# Altium footprint library Flight_controller v1.0.PcbLib: 98 footprints (part 5 of 7)
Each footprint in its own frame and in the unit in brackets; x right, y up, seen from the top. Pads: shape width x height; smd on the part's side, far side on the other; paste and mask are expansions set on the pad; w line width, h text height; cw(c..) or ccw(c..) is an arc to the next point about the centre after c.
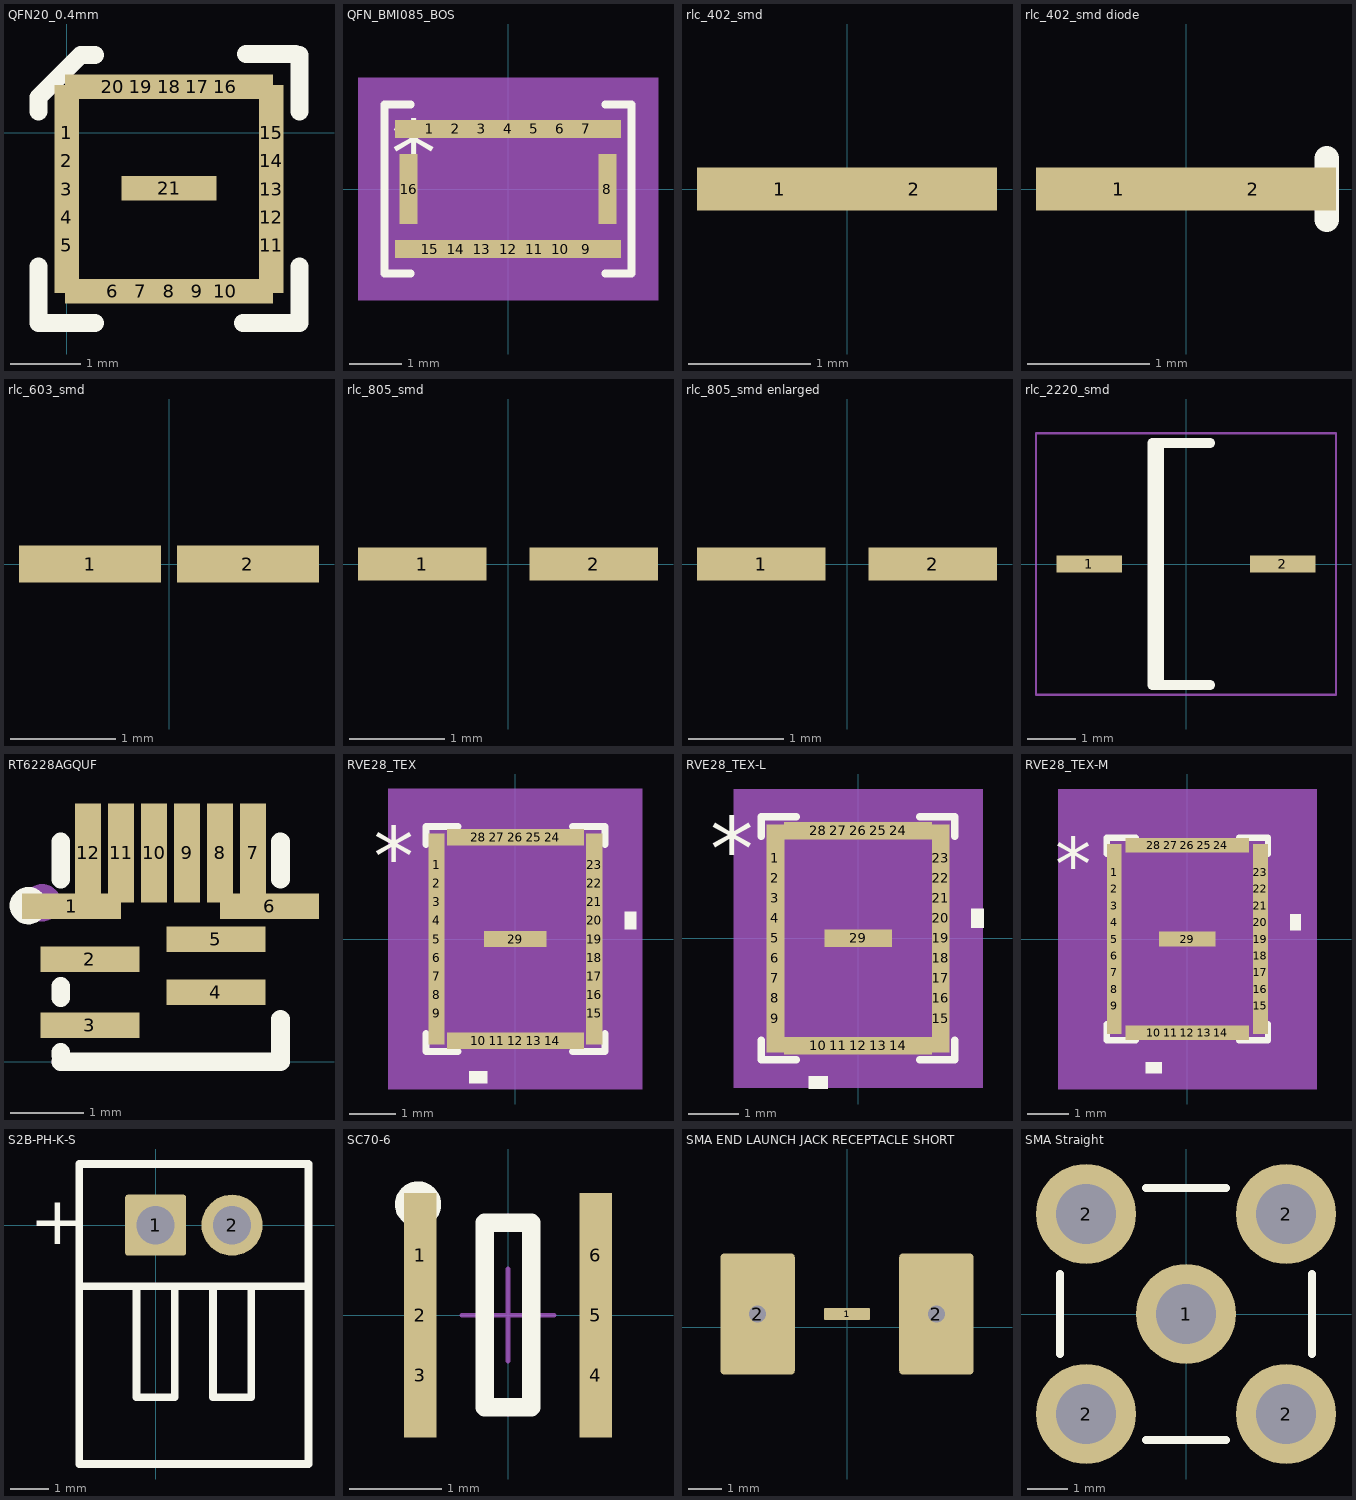
[diagram p4: the footprints below, top view; thin cyan lines are the x and y axes]

## QFN20_0.4mm [mm]
pads (21):
  rect 0.35x1.35 smd paste+0.05 mask+0.05: 1(0,0) 2(0,-0.4) 3(0,-0.8) 4(0,-1.2) 5(0,-1.6) 11(2.9,-1.6) 12(2.9,-1.2) 13(2.9,-0.8) 14(2.9,-0.4) 15(2.9,0)
  rect 1.35x0.35 smd paste+0.05 mask+0.05: 6(0.65,-2.25) 7(1.05,-2.25) 8(1.45,-2.25) 9(1.85,-2.25) 10(2.25,-2.25) 16(2.25,0.65) 17(1.85,0.65) 18(1.45,0.65) 19(1.05,0.65) 20(0.65,0.65) 21(1.45,-0.79)
Top Overlay:
  lines w0.254: -0.4,-1.9 -0.4,-2.7 0.4,-2.7 ; -0.4,0.3 -0.4,0.5 0.2,1.1 0.4,1.1 ; 2.5,-2.7 3.3,-2.7 3.3,-1.9 ; 2.54,1.11 3.24,1.11 ; 3.3,0.3 3.3,1.1

## QFN_BMI085_BOS [mm]
pads (16):
  rect 1.35x0.35 smd paste+0.05 mask+0.05: 1(-1.5,1.156) 2(-1,1.156) 3(-0.5,1.156) 4(0,1.156) 5(0.5,1.156) 6(1,1.156) 7(1.5,1.156) 9(1.5,-1.156) 10(1,-1.156) 11(0.5,-1.156) 12(0,-1.156) 13(-0.5,-1.156) 14(-1,-1.156) 15(-1.5,-1.156)
  rect 0.35x1.35 smd paste+0.05 mask+0.05: 8(1.911,0) 16(-1.911,0)
Top Overlay:
  lines w0.152: -1.869,-1.626 -2.375,-1.626 -2.375,1.626 -1.869,1.626 ; 1.869,-1.626 2.375,-1.626 2.375,1.626 1.869,1.626
  text "*" at -2.248,0.076 h1.27
Mechanical 5:
  region: -2.883,2.134 -2.883,-2.134 2.883,-2.134 2.883,2.134
Mechanical 13:
  lines w0.025: -2.248,0.229 -0.978,1.499 ; -2.248,-1.499 2.248,-1.499 2.248,1.499 -2.248,1.499 -2.248,-1.499 ; -2.248,-0.127 -2.248,0.127 -1.626,0.127 -1.626,-0.127 -2.248,-0.127 ; -1.627,-1.499 -1.373,-1.499 -1.373,-1.397 -1.627,-1.397 -1.627,-1.499 ; -1.627,1.397 -1.373,1.397 -1.373,1.499 -1.627,1.499 -1.627,1.397 ; -1.127,-1.499 -0.873,-1.499 -0.873,-1.397 -1.127,-1.397 -1.127,-1.499 ; -1.127,1.397 -0.873,1.397 -0.873,1.499 -1.127,1.499 -1.127,1.397 ; -0.627,-1.499 -0.373,-1.499 -0.373,-1.397 -0.627,-1.397 -0.627,-1.499 ; -0.627,1.397 -0.373,1.397 -0.373,1.499 -0.627,1.499 -0.627,1.397 ; -0.127,-1.499 0.127,-1.499 0.127,-1.397 -0.127,-1.397 -0.127,-1.499 ; -0.127,1.397 0.127,1.397 0.127,1.499 -0.127,1.499 -0.127,1.397 ; 0.373,-1.499 0.627,-1.499 0.627,-1.397 0.373,-1.397 0.373,-1.499 ; 0.373,1.397 0.627,1.397 0.627,1.499 0.373,1.499 0.373,1.397 ; 0.873,-1.499 1.127,-1.499 1.127,-1.397 0.873,-1.397 0.873,-1.499 ; 0.873,1.397 1.127,1.397 1.127,1.499 0.873,1.499 0.873,1.397 ; 1.373,-1.499 1.627,-1.499 1.627,-1.397 1.373,-1.397 1.373,-1.499 ; 1.373,1.397 1.627,1.397 1.627,1.499 1.373,1.499 1.373,1.397 ; 1.626,-0.127 2.248,-0.127 2.248,0.127 1.626,0.127 1.626,-0.127
  text "*" at -1.537,-0.61 h1.27
Mechanical 15:
  region: -1.75,-1.753 -2.502,-1.753 -2.502,-0.25 -2.502,0.25 -2.502,1.753 -1.75,1.753 1.75,1.753 2.502,1.753 2.502,0.25 2.502,-0.25 2.502,-1.753 1.75,-1.753
  lines w0.152: -2.502,-1.753 -2.502,-0.25 -2.502,0.25 -2.502,1.753 -1.75,1.753 1.75,1.753 2.502,1.753 2.502,0.25 2.502,-0.25 2.502,-1.753 1.75,-1.753 -1.75,-1.753 -2.502,-1.753
3D body: height 0.25, standoff 0, extent 0,0 0.254,0.254
3D body "BMI088.stp": height 1.55, standoff 0, extent -2.25,-1.5 2.25,1.5

## rlc_402_smd [mm] "Chip SMD component 402; Body 1.0 x 0.5 mm (LxW typ)"
height 0.8
pads (2):
  rect 1.35x0.35 smd paste+0.05 mask+0.05: 1(-0.55,0) 2(0.55,0)
3D body: height 0.8, standoff 0.2, extent -0.875,-0.325 0.875,0.325

## rlc_402_smd diode [mm] "Chip SMD component 402; Body 1.0 x 0.5 mm (LxW typ)"
height 0.8
pads (2):
  rect 1.35x0.35 smd paste+0.05 mask+0.05: 1(-0.55,0) 2(0.55,0)
Top Overlay:
  lines w0.2: 1.15,-0.25 1.15,0.25

## rlc_603_smd [mm] "Chip SMD component 603; Body 1.6 x 0.8mm (LxW typ)"
height 1
pads (2):
  rect 1.35x0.35 smd paste+0.05 mask+0.05: 1(-0.75,0) 2(0.75,0)

## rlc_805_smd [mm] "Chip SMD component 805; Body 2.0 x 1.25 mm (LxW typ)"
height 1.4
pads (2):
  rect 1.35x0.35 smd paste+0.05 mask+0.05: 1(-0.9,0) 2(0.9,0)

## rlc_805_smd enlarged [mm] "Chip SMD component 805; Body 2.0 x 1.25 mm (LxW typ)"
height 1.4
pads (2):
  rect 1.35x0.35 smd paste+0.05 mask+0.05: 1(-0.9,0) 2(0.9,0)

## rlc_2220_smd [mm] "Chip SMD component ; Body 5.7 x 5.0 mm (LxW typ)"
height 5
pads (2):
  rect 1.35x0.35 smd paste+0.05 mask+0.05: 1(-2,0) 2(2,0)
Top Overlay:
  lines w0.2: -0.55,-2.5 -0.55,2.5 ; 0.5,-2.5 -0.7,-2.5 -0.7,2.5 0.5,2.5
Mechanical 15:
  lines w0.05: -3.1,-2.7 -3.1,2.7 3.1,2.7 3.1,-2.7 -3.1,-2.7

## RT6228AGQUF [mm] "RT6228AGQUF DC-DC BUCK REGULATOR"
pads (12):
  rect 1.35x0.35 smd paste+0.05 mask+0.05: 1(1.302,2.12) 2(1.552,1.4) 3(1.552,0.5) 4(3.272,0.95) 5(3.272,1.67) 6(4.002,2.12)
  rect 0.35x1.35 smd paste+0.05 mask+0.05: 7(3.777,2.85) 8(3.327,2.85) 9(2.877,2.85) 10(2.427,2.85) 11(1.977,2.85) 12(1.527,2.85)
Top Overlay:
  circle w0.254: c0.712,2.13 r0.127
  lines w0.254: 1.152,0 4.152,0 4.152,0.579 ; 1.152,0.087 1.152,0.129 ; 1.152,0.871 1.152,1.029 ; 1.152,2.491 1.152,3 1.156,3 ; 4.148,3 4.152,3 4.152,2.491
Mechanical 15:
  circle w0.254: c0.902,2.17 r0.127

## RVE28_TEX [mm]
pads (29):
  rect 0.35x1.35 smd paste+0.05 mask+0.05: 1(-1.699,1.6) 2(-1.699,1.2) 3(-1.699,0.8) 4(-1.699,0.4) 5(-1.699,0) 6(-1.699,-0.4) 7(-1.699,-0.8) 8(-1.699,-1.2) 9(-1.699,-1.6) 15(1.699,-1.6) 16(1.699,-1.2) 17(1.699,-0.8) 18(1.699,-0.4) 19(1.699,0) 20(1.699,0.4) 21(1.699,0.8) 22(1.699,1.2) 23(1.699,1.6)
  rect 1.35x0.35 smd paste+0.05 mask+0.05: 10(-0.8,-2.195) 11(-0.4,-2.195) 12(0,-2.195) 13(0.4,-2.195) 14(0.8,-2.195) 24(0.8,2.195) 25(0.4,2.195) 26(0,2.195) 27(-0.4,2.195) 28(-0.8,2.195) 29(0,0)
Top Overlay:
  region: 2.357,0.59 2.611,0.59 2.611,0.209 2.357,0.209
  region: -0.61,-2.853 -0.991,-2.853 -0.991,-3.107 -0.61,-3.107
  lines w0.152: -1.93,-2.035 -1.93,-2.426 -1.235,-2.426 ; -1.93,2.035 -1.93,2.426 -1.235,2.426 ; 1.235,-2.426 1.93,-2.426 1.93,-2.035 ; 1.235,2.426 1.93,2.426 1.93,2.035
  text "*" at -3.056,1.165 h1.27
Top Paste:
  region: 1.005,-0.1 -1.005,-0.1 -1.005,-1.5 1.005,-1.5
  region: 1.005,1.5 -1.005,1.5 -1.005,0.1 1.005,0.1
Mechanical 5:
  region: 2.738,-3.234 -2.738,-3.234 -2.738,3.234 2.738,3.234
Mechanical 13:
  lines w0.025: -1.803,1.029 -0.533,2.299 ; -1.803,-2.299 -1.803,2.299 1.803,2.299 1.803,-2.299 -1.803,-2.299 ; -1.803,-1.727 -1.803,-1.473 -1.803,-1.727 ; -1.803,-1.327 -1.803,-1.073 -1.803,-1.327 ; -1.803,-0.927 -1.803,-0.673 -1.803,-0.927 ; -1.803,-0.527 -1.803,-0.273 -1.803,-0.527 ; -1.803,-0.127 -1.803,0.127 -1.803,-0.127 ; -1.803,0.273 -1.803,0.527 -1.803,0.273 ; -1.803,0.673 -1.803,0.927 -1.803,0.673 ; -1.803,1.073 -1.803,1.327 -1.803,1.073 ; -1.803,1.473 -1.803,1.727 -1.803,1.473 ; -0.927,-2.299 -0.673,-2.299 -0.927,-2.299 ; -0.927,2.299 -0.673,2.299 -0.927,2.299 ; -0.527,-2.299 -0.273,-2.299 -0.527,-2.299 ; -0.527,2.299 -0.273,2.299 -0.527,2.299 ; -0.127,-2.299 0.127,-2.299 -0.127,-2.299 ; -0.127,2.299 0.127,2.299 -0.127,2.299 ; 0.273,-2.299 0.527,-2.299 0.273,-2.299 ; 0.273,2.299 0.527,2.299 0.273,2.299 ; 0.673,-2.299 0.927,-2.299 0.673,-2.299 ; 0.673,2.299 0.927,2.299 0.673,2.299 ; 1.803,-1.727 1.803,-1.473 1.803,-1.727 ; 1.803,-1.327 1.803,-1.073 1.803,-1.327 ; 1.803,-0.927 1.803,-0.673 1.803,-0.927 ; 1.803,-0.527 1.803,-0.273 1.803,-0.527 ; 1.803,-0.127 1.803,0.127 1.803,-0.127 ; 1.803,0.273 1.803,0.527 1.803,0.273 ; 1.803,0.673 1.803,0.927 1.803,0.673 ; 1.803,1.073 1.803,1.327 1.803,1.073 ; 1.803,1.473 1.803,1.727 1.803,1.473
  text "*" at -1.613,1.165 h1.27
Mechanical 15:
  region: -1.156,-2.553 -2.057,-2.553 -2.057,-1.956 -2.357,-1.956 -2.357,1.956 -2.057,1.956 -2.057,2.553 -1.156,2.553 -1.156,2.853 1.156,2.853 1.156,2.553 2.057,2.553 2.057,1.956 2.357,1.956 2.357,-1.956 2.057,-1.956 2.057,-2.553 1.156,-2.553 1.156,-2.853 -1.156,-2.853
  lines w0.152: -2.357,-1.956 -2.357,1.956 -2.057,1.956 -2.057,2.553 -1.156,2.553 -1.156,2.853 1.156,2.853 1.156,2.553 2.057,2.553 2.057,1.956 2.357,1.956 2.357,-1.956 2.057,-1.956 2.057,-2.553 1.156,-2.553 1.156,-2.853 -1.156,-2.853 -1.156,-2.553 -2.057,-2.553 -2.057,-1.956 -2.357,-1.956
3D body "RVE28_TEX.step": height 1.65, standoff 0, extent -1.803,-2.299 1.803,2.299

## RVE28_TEX-L [mm]
pads (29):
  rect 0.35x1.35 smd paste+0.05 mask+0.05: 1(-1.649,1.6) 2(-1.649,1.2) 3(-1.649,0.8) 4(-1.649,0.4) 5(-1.649,0) 6(-1.649,-0.4) 7(-1.649,-0.8) 8(-1.649,-1.2) 9(-1.649,-1.6) 15(1.649,-1.6) 16(1.649,-1.2) 17(1.649,-0.8) 18(1.649,-0.4) 19(1.649,0) 20(1.649,0.4) 21(1.649,0.8) 22(1.649,1.2) 23(1.649,1.6)
  rect 1.35x0.35 smd paste+0.05 mask+0.05: 10(-0.8,-2.145) 11(-0.4,-2.145) 12(0,-2.145) 13(0.4,-2.145) 14(0.8,-2.145) 24(0.8,2.145) 25(0.4,2.145) 26(0,2.145) 27(-0.4,2.145) 28(-0.8,2.145) 29(0,0)
Top Overlay:
  region: 2.257,0.59 2.511,0.59 2.511,0.209 2.257,0.209
  region: -0.61,-2.753 -0.991,-2.753 -0.991,-3.007 -0.61,-3.007
  lines w0.152: -1.93,-2.035 -1.93,-2.426 -1.235,-2.426 ; -1.93,2.035 -1.93,2.426 -1.235,2.426 ; 1.235,-2.426 1.93,-2.426 1.93,-2.035 ; 1.235,2.426 1.93,2.426 1.93,2.035
  text "*" at -2.956,1.165 h1.27
Top Paste:
  region: 1.005,-0.1 -1.005,-0.1 -1.005,-1.5 1.005,-1.5
  region: 1.005,1.5 -1.005,1.5 -1.005,0.1 1.005,0.1
Mechanical 5:
  region: 2.486,-2.981 -2.486,-2.981 -2.486,2.981 2.486,2.981
Mechanical 13:
  lines w0.025: -1.803,1.029 -0.533,2.299 ; -1.803,-2.299 -1.803,2.299 1.803,2.299 1.803,-2.299 -1.803,-2.299 ; -1.803,-1.727 -1.803,-1.473 -1.803,-1.727 ; -1.803,-1.327 -1.803,-1.073 -1.803,-1.327 ; -1.803,-0.927 -1.803,-0.673 -1.803,-0.927 ; -1.803,-0.527 -1.803,-0.273 -1.803,-0.527 ; -1.803,-0.127 -1.803,0.127 -1.803,-0.127 ; -1.803,0.273 -1.803,0.527 -1.803,0.273 ; -1.803,0.673 -1.803,0.927 -1.803,0.673 ; -1.803,1.073 -1.803,1.327 -1.803,1.073 ; -1.803,1.473 -1.803,1.727 -1.803,1.473 ; -0.927,-2.299 -0.673,-2.299 -0.927,-2.299 ; -0.927,2.299 -0.673,2.299 -0.927,2.299 ; -0.527,-2.299 -0.273,-2.299 -0.527,-2.299 ; -0.527,2.299 -0.273,2.299 -0.527,2.299 ; -0.127,-2.299 0.127,-2.299 -0.127,-2.299 ; -0.127,2.299 0.127,2.299 -0.127,2.299 ; 0.273,-2.299 0.527,-2.299 0.273,-2.299 ; 0.273,2.299 0.527,2.299 0.273,2.299 ; 0.673,-2.299 0.927,-2.299 0.673,-2.299 ; 0.673,2.299 0.927,2.299 0.673,2.299 ; 1.803,-1.727 1.803,-1.473 1.803,-1.727 ; 1.803,-1.327 1.803,-1.073 1.803,-1.327 ; 1.803,-0.927 1.803,-0.673 1.803,-0.927 ; 1.803,-0.527 1.803,-0.273 1.803,-0.527 ; 1.803,-0.127 1.803,0.127 1.803,-0.127 ; 1.803,0.273 1.803,0.527 1.803,0.273 ; 1.803,0.673 1.803,0.927 1.803,0.673 ; 1.803,1.073 1.803,1.327 1.803,1.073 ; 1.803,1.473 1.803,1.727 1.803,1.473
  text "*" at -1.613,1.165 h1.27
Mechanical 15:
  region: -1.004,-2.4 -1.905,-2.4 -1.905,-1.804 -2.105,-1.804 -2.105,1.804 -1.905,1.804 -1.905,2.4 -1.004,2.4 -1.004,2.6 1.004,2.6 1.004,2.4 1.905,2.4 1.905,1.804 2.105,1.804 2.105,-1.804 1.905,-1.804 1.905,-2.4 1.004,-2.4 1.004,-2.6 -1.004,-2.6
  lines w0.152: -2.105,-1.804 -2.105,1.804 -1.905,1.804 -1.905,2.4 -1.004,2.4 -1.004,2.6 1.004,2.6 1.004,2.4 1.905,2.4 1.905,1.804 2.105,1.804 2.105,-1.804 1.905,-1.804 1.905,-2.4 1.004,-2.4 1.004,-2.6 -1.004,-2.6 -1.004,-2.4 -1.905,-2.4 -1.905,-1.804 -2.105,-1.804
3D body "RVE28_TEX.step": height 1.65, standoff 0, extent -1.803,-2.299 1.803,2.299

## RVE28_TEX-M [mm]
pads (29):
  rect 0.35x1.35 smd paste+0.05 mask+0.05: 1(-1.749,1.6) 2(-1.749,1.2) 3(-1.749,0.8) 4(-1.749,0.4) 5(-1.749,0) 6(-1.749,-0.4) 7(-1.749,-0.8) 8(-1.749,-1.2) 9(-1.749,-1.6) 15(1.749,-1.6) 16(1.749,-1.2) 17(1.749,-0.8) 18(1.749,-0.4) 19(1.749,0) 20(1.749,0.4) 21(1.749,0.8) 22(1.749,1.2) 23(1.749,1.6)
  rect 1.35x0.35 smd paste+0.05 mask+0.05: 10(-0.8,-2.245) 11(-0.4,-2.245) 12(0,-2.245) 13(0.4,-2.245) 14(0.8,-2.245) 24(0.8,2.245) 25(0.4,2.245) 26(0,2.245) 27(-0.4,2.245) 28(-0.8,2.245) 29(0,0)
Top Overlay:
  region: -0.61,-2.953 -0.991,-2.953 -0.991,-3.207 -0.61,-3.207
  region: 2.457,0.59 2.711,0.59 2.711,0.209 2.457,0.209
  lines w0.152: -1.93,-2.035 -1.93,-2.426 -1.235,-2.426 ; -1.93,2.035 -1.93,2.426 -1.235,2.426 ; 1.235,-2.426 1.93,-2.426 1.93,-2.035 ; 1.235,2.426 1.93,2.426 1.93,2.035
  text "*" at -3.156,1.165 h1.27
Top Paste:
  region: 1.005,1.5 -1.005,1.5 -1.005,0.1 1.005,0.1
  region: 1.005,-0.1 -1.005,-0.1 -1.005,-1.5 1.005,-1.5
Mechanical 5:
  region: 3.092,-3.588 -3.092,-3.588 -3.092,3.588 3.092,3.588
Mechanical 13:
  lines w0.025: -1.803,1.029 -0.533,2.299 ; -1.803,-2.299 1.803,-2.299 1.803,2.299 -1.803,2.299 -1.803,-2.299 ; -1.803,-1.727 -1.803,-1.473 -1.803,-1.727 ; -1.803,-1.327 -1.803,-1.073 -1.803,-1.327 ; -1.803,-0.927 -1.803,-0.673 -1.803,-0.927 ; -1.803,-0.527 -1.803,-0.273 -1.803,-0.527 ; -1.803,-0.127 -1.803,0.127 -1.803,-0.127 ; -1.803,0.273 -1.803,0.527 -1.803,0.273 ; -1.803,0.673 -1.803,0.927 -1.803,0.673 ; -1.803,1.073 -1.803,1.327 -1.803,1.073 ; -1.803,1.473 -1.803,1.727 -1.803,1.473 ; -0.927,-2.299 -0.673,-2.299 -0.927,-2.299 ; -0.927,2.299 -0.673,2.299 -0.927,2.299 ; -0.527,-2.299 -0.273,-2.299 -0.527,-2.299 ; -0.527,2.299 -0.273,2.299 -0.527,2.299 ; -0.127,-2.299 0.127,-2.299 -0.127,-2.299 ; -0.127,2.299 0.127,2.299 -0.127,2.299 ; 0.273,-2.299 0.527,-2.299 0.273,-2.299 ; 0.273,2.299 0.527,2.299 0.273,2.299 ; 0.673,-2.299 0.927,-2.299 0.673,-2.299 ; 0.673,2.299 0.927,2.299 0.673,2.299 ; 1.803,-1.727 1.803,-1.473 1.803,-1.727 ; 1.803,-1.327 1.803,-1.073 1.803,-1.327 ; 1.803,-0.927 1.803,-0.673 1.803,-0.927 ; 1.803,-0.527 1.803,-0.273 1.803,-0.527 ; 1.803,-0.127 1.803,0.127 1.803,-0.127 ; 1.803,0.273 1.803,0.527 1.803,0.273 ; 1.803,0.673 1.803,0.927 1.803,0.673 ; 1.803,1.073 1.803,1.327 1.803,1.073 ; 1.803,1.473 1.803,1.727 1.803,1.473
  text "*" at -1.613,1.165 h1.27
Mechanical 15:
  region: -1.41,-2.807 -2.311,-2.807 -2.311,-2.21 -2.711,-2.21 -2.711,2.21 -2.311,2.21 -2.311,2.807 -1.41,2.807 -1.41,3.207 1.41,3.207 1.41,2.807 2.311,2.807 2.311,2.21 2.711,2.21 2.711,-2.21 2.311,-2.21 2.311,-2.807 1.41,-2.807 1.41,-3.207 -1.41,-3.207
  lines w0.152: -2.711,-2.21 -2.311,-2.21 -2.311,-2.807 -1.41,-2.807 -1.41,-3.207 1.41,-3.207 1.41,-2.807 2.311,-2.807 2.311,-2.21 2.711,-2.21 2.711,2.21 2.311,2.21 2.311,2.807 1.41,2.807 1.41,3.207 -1.41,3.207 -1.41,2.807 -2.311,2.807 -2.311,2.21 -2.711,2.21 -2.711,-2.21
3D body "RVE28_TEX.step": height 1.65, standoff 0, extent -1.803,-2.299 1.803,2.299

## S2B-PH-K-S [mm] "S2B-PH-K-S; JST; Battery Connector side entry; Header; 2 Position"
pads (2):
  rrect10% 1.6x1.6 hole 1: 1(0,0)
  round 1.6 hole 1: 2(2,0)
Top Overlay:
  lines w0.2: -2,-1.6 4,-1.6 ; -0.5,-1.6 -0.5,-4.5 0.5,-4.5 0.5,-1.6 ; 1.5,-1.6 1.5,-4.5 2.5,-4.5 2.5,-1.6 ; -2,-6.25 -2,1.6 4,1.6 4,-6.25 -2,-6.25
  text "+" at -3.3,-0.5 h1.27
3D body: height 2.95, standoff 0, extent -2,-6.25 4,1.6

## SC70-6 [mm] "SC70 6-Leads, Body 2.0x1.25mm, Pitch 0.65mm"
height 1.45
pads (6):
  rect 0.35x1.35 smd paste+0.05 mask+0.05: 1(-0.95,0.65) 2(-0.95,0) 3(-0.95,-0.65) 4(0.95,-0.65) 5(0.95,0) 6(0.95,0.65)
Top Overlay:
  circle w0.2: c-0.975,1.2 r0.15
  lines w0.2: -0.25,-1 0.25,-1 0.25,1 -0.25,1 -0.25,-1
Mechanical 15:
  lines w0.05: -0.5,0 0.5,0 ; 0,-0.5 0,0.5
3D body: height 1.45, standoff 0, extent -0.625,-1 0.625,1

## SMA END LAUNCH JACK RECEPTACLE SHORT [mm] "SMA Connector - End Launch Jack Receptacle - Short"
height 8
pads (3):
  rrect10% 1.35x0.35 smd paste+0.05 mask+0.05: 1(0,0.4)
  rrect10% 2.2x3.6 hole 0.5 mask+0.1: 2(-2.65,0.4) 2(2.65,0.4)
3D body: height 2.95, standoff 0, extent -0.325,-0.4 0.325,0.4

## SMA Straight [mm] "SMA Connector; Straight"
height 10
pads (5):
  round 2.5 hole 1.5 paste+0 mask+0.1: 1(0,0) 2(-2.5,-2.5) 2(-2.5,2.5) 2(2.5,-2.5) 2(2.5,2.5)
Top Overlay:
  lines w0.2: -3.15,-1 -3.15,1 ; -1,-3.15 1,-3.15 ; -1,3.15 1,3.15 ; 3.15,-1 3.15,1
Mechanical 1:
  circle w0.025: c0,0 r0.2